# Altium schematic symbol library Connector.SchLib: 394 symbols (part 3 of 4)
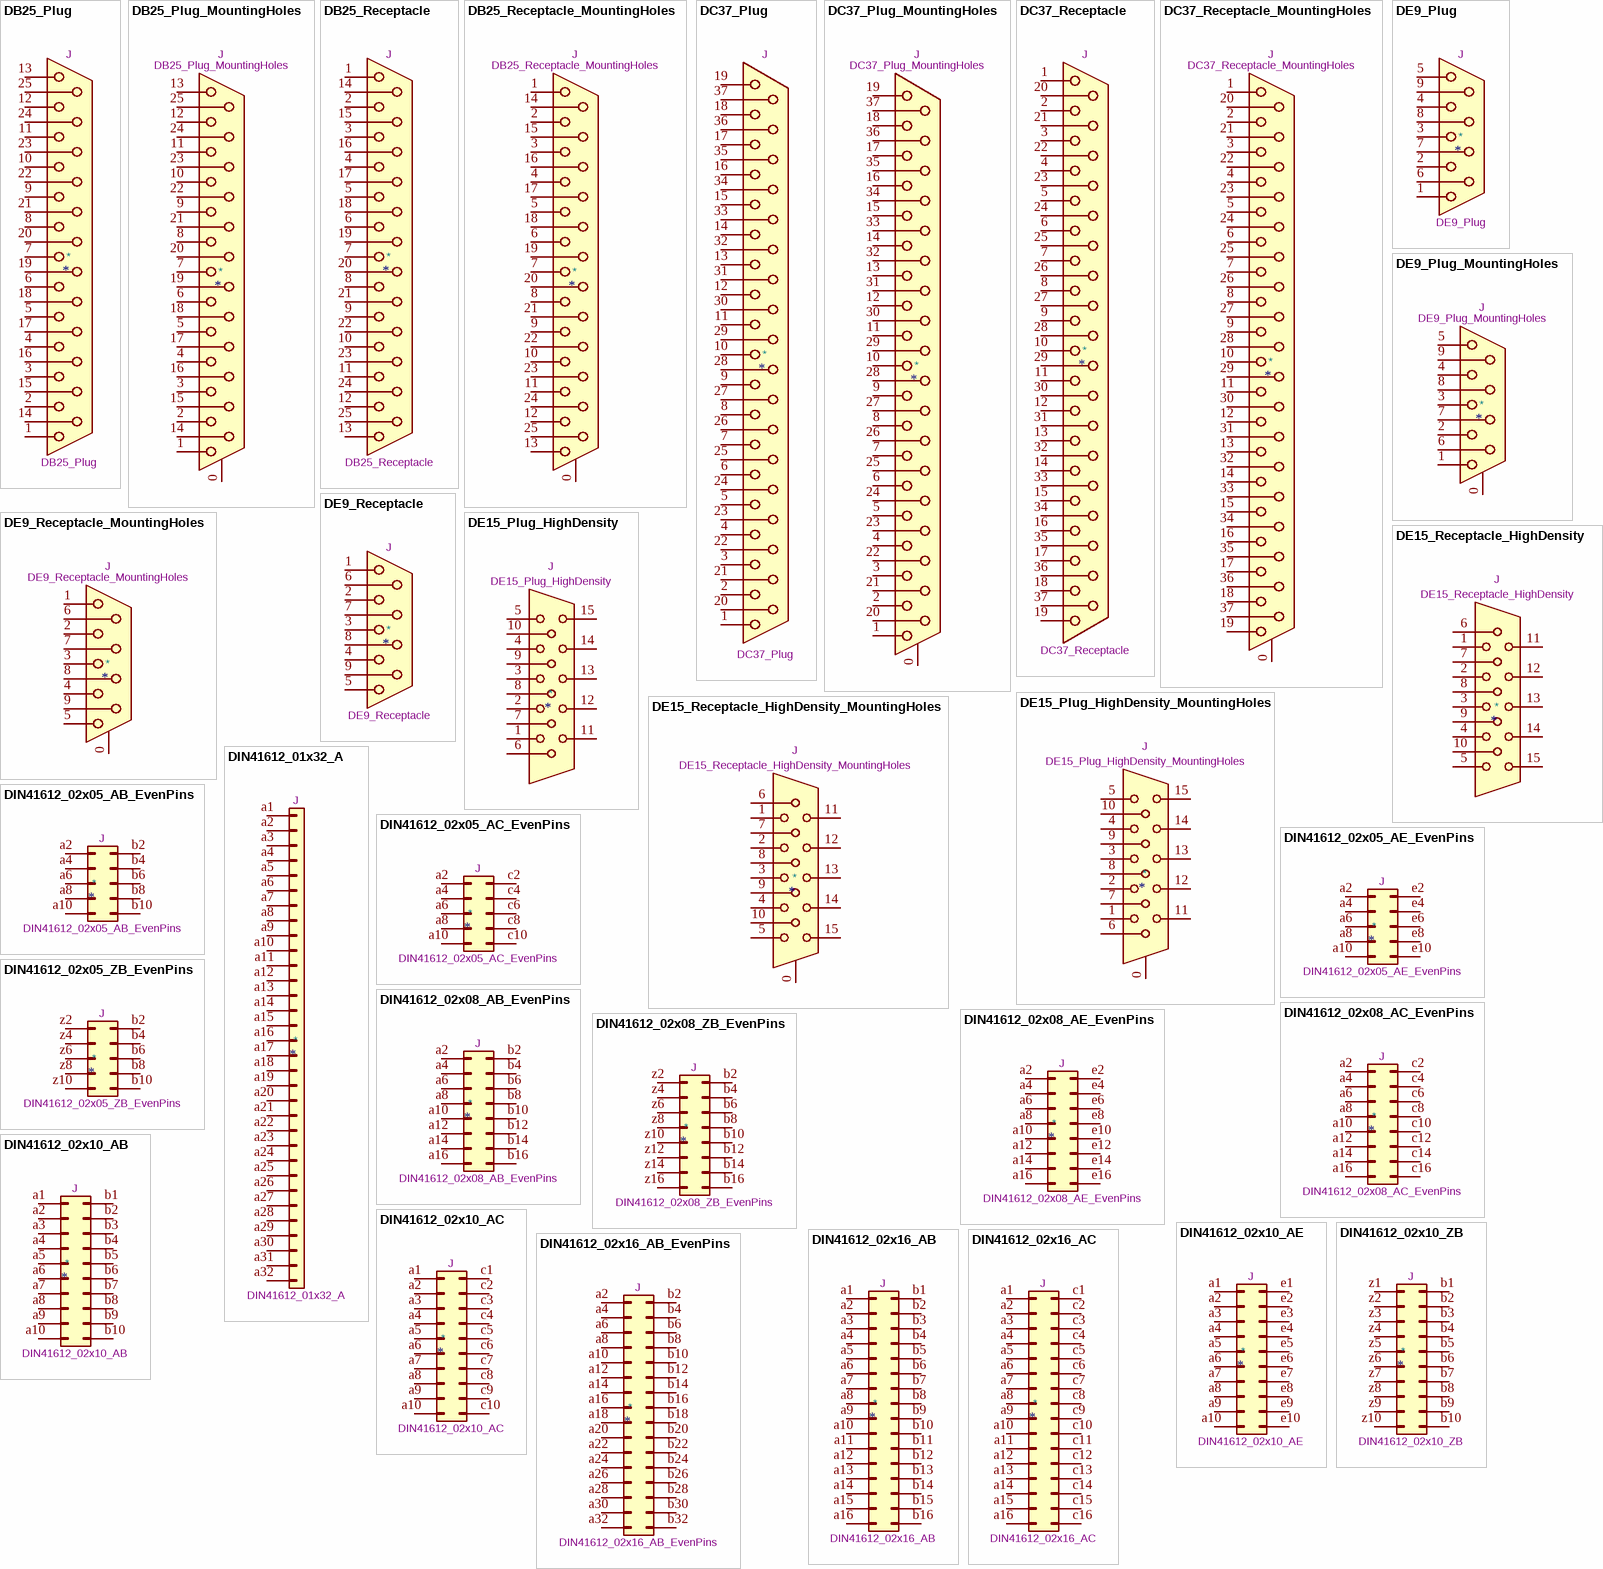
[diagram p19: symbols DB25_Plug to DIN41612_02x16_AC]

## DIN41612_02x10_AB
designator *  value DIN41612_02x10_AB  Reference: J
DIN41612 connector, double row (AB), 02x10, script generated (kicad-library-utils/schlib/autogen/connector/); ki_fp_filters: DIN41612*2x*; Datasheet: ~; Description_: DIN41612 connector, double row (AB), 02x10, script generated (kicad-library-utils/schlib/autogen/connector/); ki_keywords: connector
pins: a1 Pin_a1, a2 Pin_a2, a3 Pin_a3, a4 Pin_a4, a5 Pin_a5, a6 Pin_a6, a7 Pin_a7, a8 Pin_a8, a9 Pin_a9, a10 Pin_a10, b1 Pin_b1, b2 Pin_b2, b3 Pin_b3, b4 Pin_b4, b5 Pin_b5, b6 Pin_b6, b7 Pin_b7, b8 Pin_b8, b9 Pin_b9, b10 Pin_b10

## DIN41612_02x10_AC
designator *  value DIN41612_02x10_AC  Reference: J
DIN41612 connector, double row (AC), 02x10, script generated (kicad-library-utils/schlib/autogen/connector/); ki_fp_filters: DIN41612*2x*; Datasheet: ~; Description_: DIN41612 connector, double row (AC), 02x10, script generated (kicad-library-utils/schlib/autogen/connector/); ki_keywords: connector
pins: a1 Pin_a1, a2 Pin_a2, a3 Pin_a3, a4 Pin_a4, a5 Pin_a5, a6 Pin_a6, a7 Pin_a7, a8 Pin_a8, a9 Pin_a9, a10 Pin_a10, c1 Pin_c1, c2 Pin_c2, c3 Pin_c3, c4 Pin_c4, c5 Pin_c5, c6 Pin_c6, c7 Pin_c7, c8 Pin_c8, c9 Pin_c9, c10 Pin_c10

## DIN41612_02x10_AE
designator *  value DIN41612_02x10_AE  Reference: J
DIN41612 connector, double row (AE), 02x10, script generated (kicad-library-utils/schlib/autogen/connector/); ki_fp_filters: DIN41612*2x*; Datasheet: ~; Description_: DIN41612 connector, double row (AE), 02x10, script generated (kicad-library-utils/schlib/autogen/connector/); ki_keywords: connector
pins: a1 Pin_a1, a2 Pin_a2, a3 Pin_a3, a4 Pin_a4, a5 Pin_a5, a6 Pin_a6, a7 Pin_a7, a8 Pin_a8, a9 Pin_a9, a10 Pin_a10, e1 Pin_e1, e2 Pin_e2, e3 Pin_e3, e4 Pin_e4, e5 Pin_e5, e6 Pin_e6, e7 Pin_e7, e8 Pin_e8, e9 Pin_e9, e10 Pin_e10

## DIN41612_02x10_ZB
designator *  value DIN41612_02x10_ZB  Reference: J
DIN41612 connector, double row (ZB), 02x10, script generated (kicad-library-utils/schlib/autogen/connector/); ki_fp_filters: DIN41612*2x*; Datasheet: ~; Description_: DIN41612 connector, double row (ZB), 02x10, script generated (kicad-library-utils/schlib/autogen/connector/); ki_keywords: connector
pins: b1 Pin_b1, b2 Pin_b2, b3 Pin_b3, b4 Pin_b4, b5 Pin_b5, b6 Pin_b6, b7 Pin_b7, b8 Pin_b8, b9 Pin_b9, b10 Pin_b10, z1 Pin_z1, z2 Pin_z2, z3 Pin_z3, z4 Pin_z4, z5 Pin_z5, z6 Pin_z6, z7 Pin_z7, z8 Pin_z8, z9 Pin_z9, z10 Pin_z10

## DIN41612_02x16_AB
designator *  value DIN41612_02x16_AB  Reference: J
DIN41612 connector, double row (AB), 02x16, script generated (kicad-library-utils/schlib/autogen/connector/); ki_fp_filters: DIN41612*2x*; Datasheet: ~; Description_: DIN41612 connector, double row (AB), 02x16, script generated (kicad-library-utils/schlib/autogen/connector/); ki_keywords: connector
pins: a1 Pin_a1, a2 Pin_a2, a3 Pin_a3, a4 Pin_a4, a5 Pin_a5, a6 Pin_a6, a7 Pin_a7, a8 Pin_a8, a9 Pin_a9, a10 Pin_a10, a11 Pin_a11, a12 Pin_a12, a13 Pin_a13, a14 Pin_a14, a15 Pin_a15, a16 Pin_a16, b1 Pin_b1, b2 Pin_b2, b3 Pin_b3, b4 Pin_b4, b5 Pin_b5, b6 Pin_b6, b7 Pin_b7, b8 Pin_b8, b9 Pin_b9, b10 Pin_b10, b11 Pin_b11, b12 Pin_b12, b13 Pin_b13, b14 Pin_b14, b15 Pin_b15, b16 Pin_b16

## DIN41612_02x16_AB_EvenPins
designator *  value DIN41612_02x16_AB_EvenPins  Reference: J
DIN41612 connector, double row (AB) even pins only, 02x16, script generated (kicad-library-utils/schlib/autogen/connector/); ki_fp_filters: DIN41612*2x*; Datasheet: ~; Description_: DIN41612 connector, double row (AB) even pins only, 02x16, script generated (kicad-library-utils/schlib/autogen/connector/); ki_keywords: connector
pins: a2 Pin_a2, a4 Pin_a4, a6 Pin_a6, a8 Pin_a8, a10 Pin_a10, a12 Pin_a12, a14 Pin_a14, a16 Pin_a16, a18 Pin_a18, a20 Pin_a20, a22 Pin_a22, a24 Pin_a24, a26 Pin_a26, a28 Pin_a28, a30 Pin_a30, a32 Pin_a32, b2 Pin_b2, b4 Pin_b4, b6 Pin_b6, b8 Pin_b8, b10 Pin_b10, b12 Pin_b12, b14 Pin_b14, b16 Pin_b16, b18 Pin_b18, b20 Pin_b20, b22 Pin_b22, b24 Pin_b24, b26 Pin_b26, b28 Pin_b28, b30 Pin_b30, b32 Pin_b32

## DIN41612_02x16_AC
designator *  value DIN41612_02x16_AC  Reference: J
DIN41612 connector, double row (AC), 02x16, script generated (kicad-library-utils/schlib/autogen/connector/); ki_fp_filters: DIN41612*2x*; Datasheet: ~; Description_: DIN41612 connector, double row (AC), 02x16, script generated (kicad-library-utils/schlib/autogen/connector/); ki_keywords: connector
pins: a1 Pin_a1, a2 Pin_a2, a3 Pin_a3, a4 Pin_a4, a5 Pin_a5, a6 Pin_a6, a7 Pin_a7, a8 Pin_a8, a9 Pin_a9, a10 Pin_a10, a11 Pin_a11, a12 Pin_a12, a13 Pin_a13, a14 Pin_a14, a15 Pin_a15, a16 Pin_a16, c1 Pin_c1, c2 Pin_c2, c3 Pin_c3, c4 Pin_c4, c5 Pin_c5, c6 Pin_c6, c7 Pin_c7, c8 Pin_c8, c9 Pin_c9, c10 Pin_c10, c11 Pin_c11, c12 Pin_c12, c13 Pin_c13, c14 Pin_c14, c15 Pin_c15, c16 Pin_c16

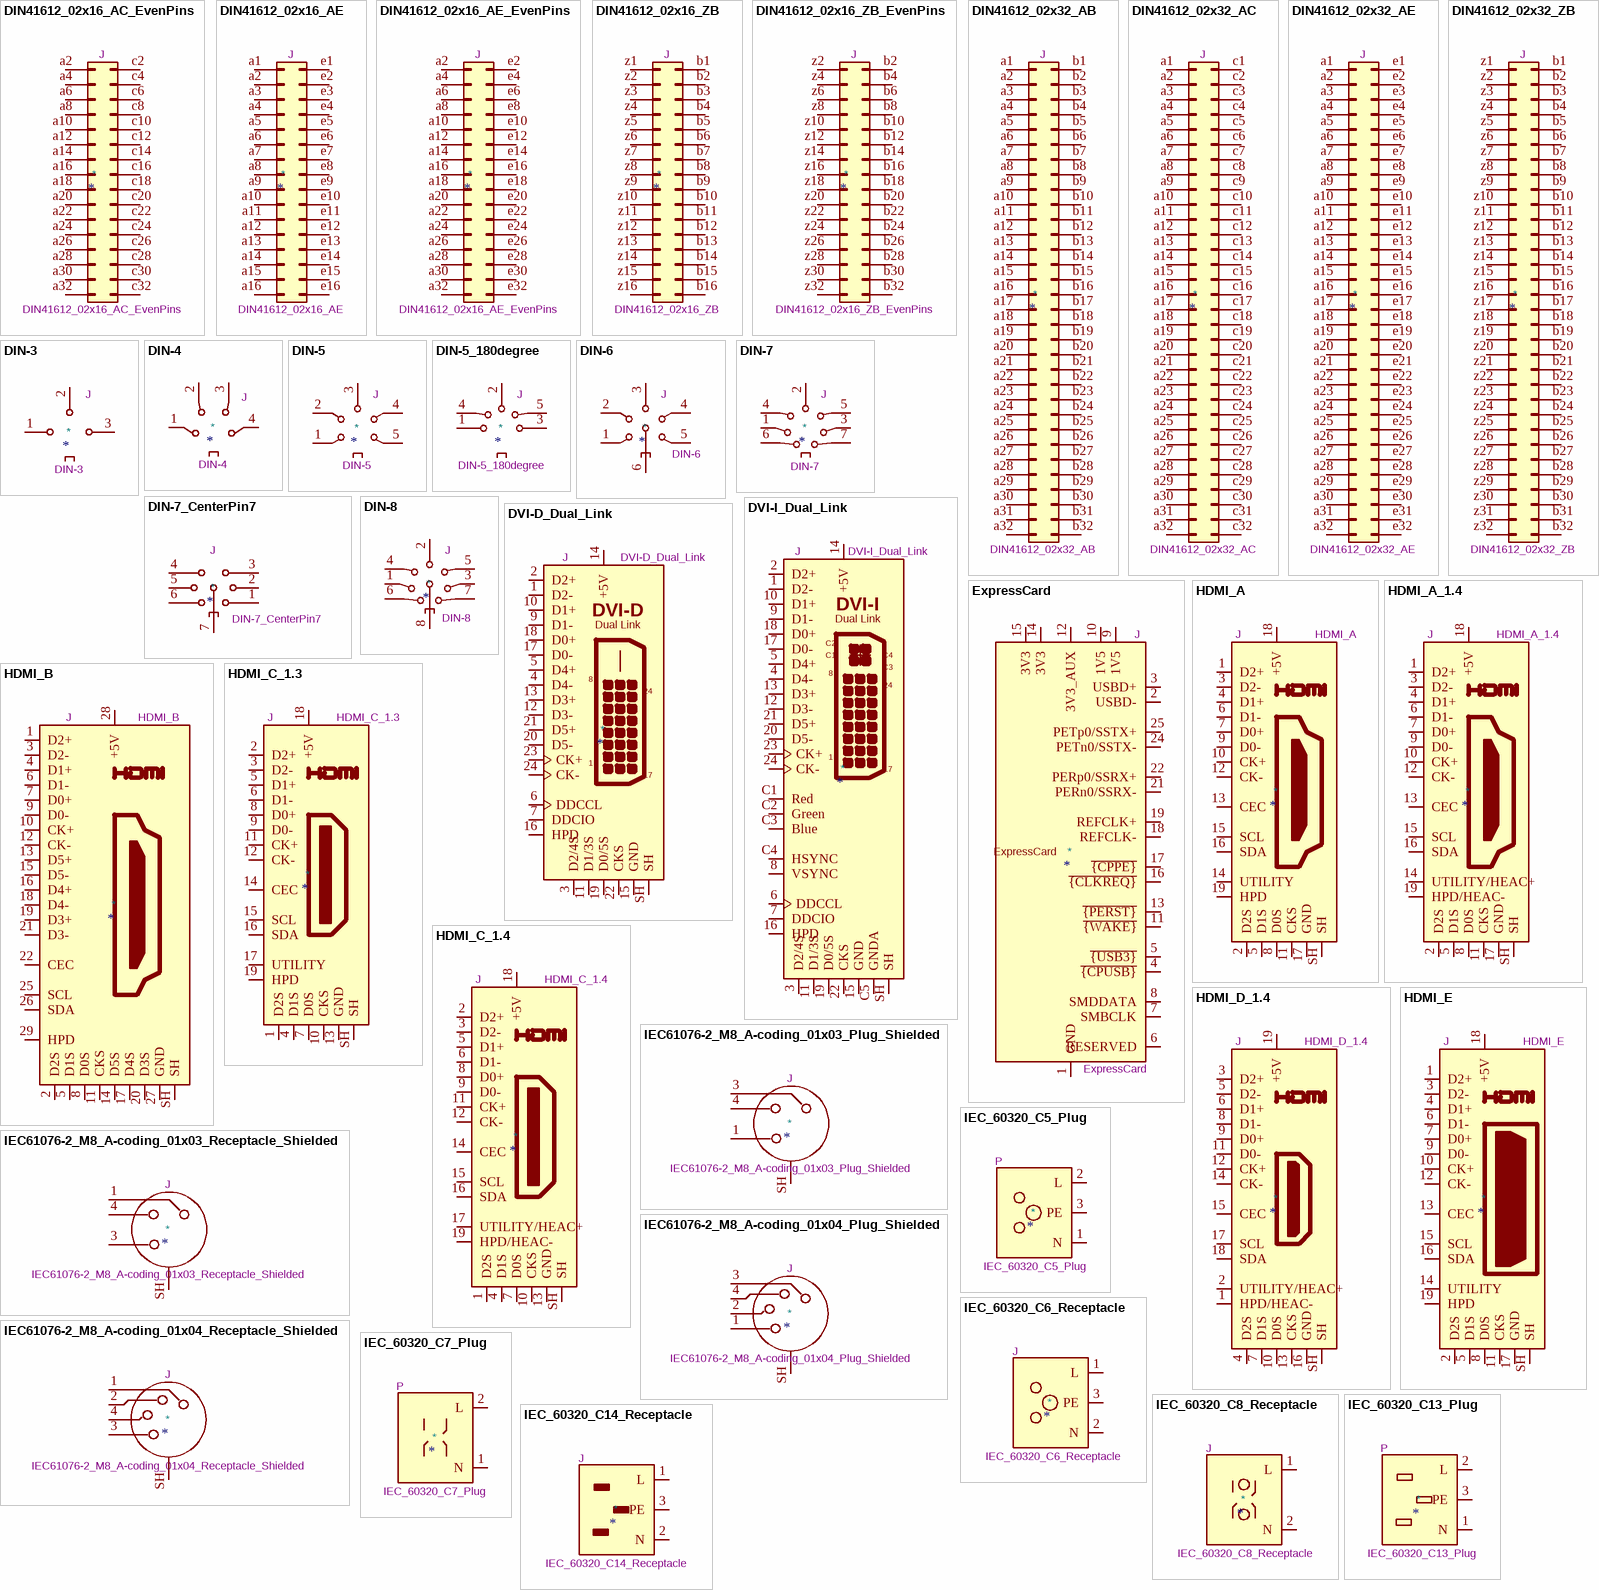
[diagram p10: symbols DIN41612_02x16_AC_EvenPins to IEC_60320_C14_Receptacle]

## DIN41612_02x16_AC_EvenPins
designator *  value DIN41612_02x16_AC_EvenPins  Reference: J
DIN41612 connector, double row (AC) even pins only, 02x16, script generated (kicad-library-utils/schlib/autogen/connector/); ki_fp_filters: DIN41612*2x*; Datasheet: ~; Description_: DIN41612 connector, double row (AC) even pins only, 02x16, script generated (kicad-library-utils/schlib/autogen/connector/); ki_keywords: connector
pins: a2 Pin_a2, a4 Pin_a4, a6 Pin_a6, a8 Pin_a8, a10 Pin_a10, a12 Pin_a12, a14 Pin_a14, a16 Pin_a16, a18 Pin_a18, a20 Pin_a20, a22 Pin_a22, a24 Pin_a24, a26 Pin_a26, a28 Pin_a28, a30 Pin_a30, a32 Pin_a32, c2 Pin_c2, c4 Pin_c4, c6 Pin_c6, c8 Pin_c8, c10 Pin_c10, c12 Pin_c12, c14 Pin_c14, c16 Pin_c16, c18 Pin_c18, c20 Pin_c20, c22 Pin_c22, c24 Pin_c24, c26 Pin_c26, c28 Pin_c28, c30 Pin_c30, c32 Pin_c32

## DIN41612_02x16_AE
designator *  value DIN41612_02x16_AE  Reference: J
DIN41612 connector, double row (AE), 02x16, script generated (kicad-library-utils/schlib/autogen/connector/); ki_fp_filters: DIN41612*2x*; Datasheet: ~; Description_: DIN41612 connector, double row (AE), 02x16, script generated (kicad-library-utils/schlib/autogen/connector/); ki_keywords: connector
pins: a1 Pin_a1, a2 Pin_a2, a3 Pin_a3, a4 Pin_a4, a5 Pin_a5, a6 Pin_a6, a7 Pin_a7, a8 Pin_a8, a9 Pin_a9, a10 Pin_a10, a11 Pin_a11, a12 Pin_a12, a13 Pin_a13, a14 Pin_a14, a15 Pin_a15, a16 Pin_a16, e1 Pin_e1, e2 Pin_e2, e3 Pin_e3, e4 Pin_e4, e5 Pin_e5, e6 Pin_e6, e7 Pin_e7, e8 Pin_e8, e9 Pin_e9, e10 Pin_e10, e11 Pin_e11, e12 Pin_e12, e13 Pin_e13, e14 Pin_e14, e15 Pin_e15, e16 Pin_e16

## DIN41612_02x16_AE_EvenPins
designator *  value DIN41612_02x16_AE_EvenPins  Reference: J
DIN41612 connector, double row (AE) even pins only, 02x16, script generated (kicad-library-utils/schlib/autogen/connector/); ki_fp_filters: DIN41612*2x*; Datasheet: ~; Description_: DIN41612 connector, double row (AE) even pins only, 02x16, script generated (kicad-library-utils/schlib/autogen/connector/); ki_keywords: connector
pins: a2 Pin_a2, a4 Pin_a4, a6 Pin_a6, a8 Pin_a8, a10 Pin_a10, a12 Pin_a12, a14 Pin_a14, a16 Pin_a16, a18 Pin_a18, a20 Pin_a20, a22 Pin_a22, a24 Pin_a24, a26 Pin_a26, a28 Pin_a28, a30 Pin_a30, a32 Pin_a32, e2 Pin_e2, e4 Pin_e4, e6 Pin_e6, e8 Pin_e8, e10 Pin_e10, e12 Pin_e12, e14 Pin_e14, e16 Pin_e16, e18 Pin_e18, e20 Pin_e20, e22 Pin_e22, e24 Pin_e24, e26 Pin_e26, e28 Pin_e28, e30 Pin_e30, e32 Pin_e32

## DIN41612_02x16_ZB
designator *  value DIN41612_02x16_ZB  Reference: J
DIN41612 connector, double row (ZB), 02x16, script generated (kicad-library-utils/schlib/autogen/connector/); ki_fp_filters: DIN41612*2x*; Datasheet: ~; Description_: DIN41612 connector, double row (ZB), 02x16, script generated (kicad-library-utils/schlib/autogen/connector/); ki_keywords: connector
pins: b1 Pin_b1, b2 Pin_b2, b3 Pin_b3, b4 Pin_b4, b5 Pin_b5, b6 Pin_b6, b7 Pin_b7, b8 Pin_b8, b9 Pin_b9, b10 Pin_b10, b11 Pin_b11, b12 Pin_b12, b13 Pin_b13, b14 Pin_b14, b15 Pin_b15, b16 Pin_b16, z1 Pin_z1, z2 Pin_z2, z3 Pin_z3, z4 Pin_z4, z5 Pin_z5, z6 Pin_z6, z7 Pin_z7, z8 Pin_z8, z9 Pin_z9, z10 Pin_z10, z11 Pin_z11, z12 Pin_z12, z13 Pin_z13, z14 Pin_z14, z15 Pin_z15, z16 Pin_z16

## DIN41612_02x16_ZB_EvenPins
designator *  value DIN41612_02x16_ZB_EvenPins  Reference: J
DIN41612 connector, double row (ZB) even pins only, 02x16, script generated (kicad-library-utils/schlib/autogen/connector/); ki_fp_filters: DIN41612*2x*; Datasheet: ~; Description_: DIN41612 connector, double row (ZB) even pins only, 02x16, script generated (kicad-library-utils/schlib/autogen/connector/); ki_keywords: connector
pins: b2 Pin_b2, b4 Pin_b4, b6 Pin_b6, b8 Pin_b8, b10 Pin_b10, b12 Pin_b12, b14 Pin_b14, b16 Pin_b16, b18 Pin_b18, b20 Pin_b20, b22 Pin_b22, b24 Pin_b24, b26 Pin_b26, b28 Pin_b28, b30 Pin_b30, b32 Pin_b32, z2 Pin_z2, z4 Pin_z4, z6 Pin_z6, z8 Pin_z8, z10 Pin_z10, z12 Pin_z12, z14 Pin_z14, z16 Pin_z16, z18 Pin_z18, z20 Pin_z20, z22 Pin_z22, z24 Pin_z24, z26 Pin_z26, z28 Pin_z28, z30 Pin_z30, z32 Pin_z32

## DIN41612_02x32_AB
designator *  value DIN41612_02x32_AB  Reference: J
DIN41612 connector, double row (AB), 02x32, script generated (kicad-library-utils/schlib/autogen/connector/); ki_fp_filters: DIN41612*2x*; Datasheet: ~; Description_: DIN41612 connector, double row (AB), 02x32, script generated (kicad-library-utils/schlib/autogen/connector/); ki_keywords: connector
pins: a1 Pin_a1, a2 Pin_a2, a3 Pin_a3, a4 Pin_a4, a5 Pin_a5, a6 Pin_a6, a7 Pin_a7, a8 Pin_a8, a9 Pin_a9, a10 Pin_a10, a11 Pin_a11, a12 Pin_a12, a13 Pin_a13, a14 Pin_a14, a15 Pin_a15, a16 Pin_a16, a17 Pin_a17, a18 Pin_a18, a19 Pin_a19, a20 Pin_a20, a21 Pin_a21, a22 Pin_a22, a23 Pin_a23, a24 Pin_a24, a25 Pin_a25, a26 Pin_a26, a27 Pin_a27, a28 Pin_a28, a29 Pin_a29, a30 Pin_a30, a31 Pin_a31, a32 Pin_a32, b1 Pin_b1, b2 Pin_b2, b3 Pin_b3, b4 Pin_b4, b5 Pin_b5, b6 Pin_b6, b7 Pin_b7, b8 Pin_b8, b9 Pin_b9, b10 Pin_b10, b11 Pin_b11, b12 Pin_b12, b13 Pin_b13, b14 Pin_b14, b15 Pin_b15, b16 Pin_b16, b17 Pin_b17, b18 Pin_b18, b19 Pin_b19, b20 Pin_b20, b21 Pin_b21, b22 Pin_b22, b23 Pin_b23, b24 Pin_b24, b25 Pin_b25, b26 Pin_b26, b27 Pin_b27, b28 Pin_b28, b29 Pin_b29, b30 Pin_b30, b31 Pin_b31, b32 Pin_b32

## DIN41612_02x32_AC
designator *  value DIN41612_02x32_AC  Reference: J
DIN41612 connector, double row (AC), 02x32, script generated (kicad-library-utils/schlib/autogen/connector/); ki_fp_filters: DIN41612*2x*; Datasheet: ~; Description_: DIN41612 connector, double row (AC), 02x32, script generated (kicad-library-utils/schlib/autogen/connector/); ki_keywords: connector
pins: a1 Pin_a1, a2 Pin_a2, a3 Pin_a3, a4 Pin_a4, a5 Pin_a5, a6 Pin_a6, a7 Pin_a7, a8 Pin_a8, a9 Pin_a9, a10 Pin_a10, a11 Pin_a11, a12 Pin_a12, a13 Pin_a13, a14 Pin_a14, a15 Pin_a15, a16 Pin_a16, a17 Pin_a17, a18 Pin_a18, a19 Pin_a19, a20 Pin_a20, a21 Pin_a21, a22 Pin_a22, a23 Pin_a23, a24 Pin_a24, a25 Pin_a25, a26 Pin_a26, a27 Pin_a27, a28 Pin_a28, a29 Pin_a29, a30 Pin_a30, a31 Pin_a31, a32 Pin_a32, c1 Pin_c1, c2 Pin_c2, c3 Pin_c3, c4 Pin_c4, c5 Pin_c5, c6 Pin_c6, c7 Pin_c7, c8 Pin_c8, c9 Pin_c9, c10 Pin_c10, c11 Pin_c11, c12 Pin_c12, c13 Pin_c13, c14 Pin_c14, c15 Pin_c15, c16 Pin_c16, c17 Pin_c17, c18 Pin_c18, c19 Pin_c19, c20 Pin_c20, c21 Pin_c21, c22 Pin_c22, c23 Pin_c23, c24 Pin_c24, c25 Pin_c25, c26 Pin_c26, c27 Pin_c27, c28 Pin_c28, c29 Pin_c29, c30 Pin_c30, c31 Pin_c31, c32 Pin_c32

## DIN41612_02x32_AE
designator *  value DIN41612_02x32_AE  Reference: J
DIN41612 connector, double row (AE), 02x32, script generated (kicad-library-utils/schlib/autogen/connector/); ki_fp_filters: DIN41612*2x*; Datasheet: ~; Description_: DIN41612 connector, double row (AE), 02x32, script generated (kicad-library-utils/schlib/autogen/connector/); ki_keywords: connector
pins: a1 Pin_a1, a2 Pin_a2, a3 Pin_a3, a4 Pin_a4, a5 Pin_a5, a6 Pin_a6, a7 Pin_a7, a8 Pin_a8, a9 Pin_a9, a10 Pin_a10, a11 Pin_a11, a12 Pin_a12, a13 Pin_a13, a14 Pin_a14, a15 Pin_a15, a16 Pin_a16, a17 Pin_a17, a18 Pin_a18, a19 Pin_a19, a20 Pin_a20, a21 Pin_a21, a22 Pin_a22, a23 Pin_a23, a24 Pin_a24, a25 Pin_a25, a26 Pin_a26, a27 Pin_a27, a28 Pin_a28, a29 Pin_a29, a30 Pin_a30, a31 Pin_a31, a32 Pin_a32, e1 Pin_e1, e2 Pin_e2, e3 Pin_e3, e4 Pin_e4, e5 Pin_e5, e6 Pin_e6, e7 Pin_e7, e8 Pin_e8, e9 Pin_e9, e10 Pin_e10, e11 Pin_e11, e12 Pin_e12, e13 Pin_e13, e14 Pin_e14, e15 Pin_e15, e16 Pin_e16, e17 Pin_e17, e18 Pin_e18, e19 Pin_e19, e20 Pin_e20, e21 Pin_e21, e22 Pin_e22, e23 Pin_e23, e24 Pin_e24, e25 Pin_e25, e26 Pin_e26, e27 Pin_e27, e28 Pin_e28, e29 Pin_e29, e30 Pin_e30, e31 Pin_e31, e32 Pin_e32

## DIN41612_02x32_ZB
designator *  value DIN41612_02x32_ZB  Reference: J
DIN41612 connector, double row (ZB), 02x32, script generated (kicad-library-utils/schlib/autogen/connector/); ki_fp_filters: DIN41612*2x*; Datasheet: ~; Description_: DIN41612 connector, double row (ZB), 02x32, script generated (kicad-library-utils/schlib/autogen/connector/); ki_keywords: connector
pins: b1 Pin_b1, b2 Pin_b2, b3 Pin_b3, b4 Pin_b4, b5 Pin_b5, b6 Pin_b6, b7 Pin_b7, b8 Pin_b8, b9 Pin_b9, b10 Pin_b10, b11 Pin_b11, b12 Pin_b12, b13 Pin_b13, b14 Pin_b14, b15 Pin_b15, b16 Pin_b16, b17 Pin_b17, b18 Pin_b18, b19 Pin_b19, b20 Pin_b20, b21 Pin_b21, b22 Pin_b22, b23 Pin_b23, b24 Pin_b24, b25 Pin_b25, b26 Pin_b26, b27 Pin_b27, b28 Pin_b28, b29 Pin_b29, b30 Pin_b30, b31 Pin_b31, b32 Pin_b32, z1 Pin_z1, z2 Pin_z2, z3 Pin_z3, z4 Pin_z4, z5 Pin_z5, z6 Pin_z6, z7 Pin_z7, z8 Pin_z8, z9 Pin_z9, z10 Pin_z10, z11 Pin_z11, z12 Pin_z12, z13 Pin_z13, z14 Pin_z14, z15 Pin_z15, z16 Pin_z16, z17 Pin_z17, z18 Pin_z18, z19 Pin_z19, z20 Pin_z20, z21 Pin_z21, z22 Pin_z22, z23 Pin_z23, z24 Pin_z24, z25 Pin_z25, z26 Pin_z26, z27 Pin_z27, z28 Pin_z28, z29 Pin_z29, z30 Pin_z30, z31 Pin_z31, z32 Pin_z32

## DIN-3
designator *  value DIN-3  Reference: J
3-pin DIN connector; ki_keywords: circular DIN connector; ki_fp_filters: DIN*; Datasheet: http://www.mouser.com/ds/2/18/40_c091_abd_e-75918.pdf; Description_: 3-pin DIN connector
pins: 1, 2, 3

## DIN-4
designator *  value DIN-4  Reference: J
4-pin DIN connector; ki_keywords: circular DIN connector; ki_fp_filters: DIN*; Datasheet: http://www.mouser.com/ds/2/18/40_c091_abd_e-75918.pdf; Description_: 4-pin DIN connector
pins: 1, 2, 3, 4

## DIN-5
designator *  value DIN-5  Reference: J
5-pin DIN connector; ki_keywords: circular DIN connector; ki_fp_filters: DIN*; Datasheet: http://www.mouser.com/ds/2/18/40_c091_abd_e-75918.pdf; Description_: 5-pin DIN connector
pins: 1, 2, 3, 4, 5

## DIN-5_180degree
designator *  value DIN-5_180degree  Reference: J
5-pin DIN connector (5-pin DIN-5 stereo); ki_keywords: circular DIN connector stereo audio; ki_fp_filters: DIN*; Datasheet: http://www.mouser.com/ds/2/18/40_c091_abd_e-75918.pdf; Description_: 5-pin DIN connector (5-pin DIN-5 stereo)
pins: 1, 2, 3, 4, 5
